# Altium footprint library ThroHoleCap.PcbLib: 81 footprints (part 5 of 6)
Each footprint in its own frame and in the unit in brackets; x right, y up, seen from the top. Pads: shape width x height; smd on the part's side, far side on the other; paste and mask are expansions set on the pad; w line width, h text height; cw(c..) or ccw(c..) is an arc to the next point about the centre after c.
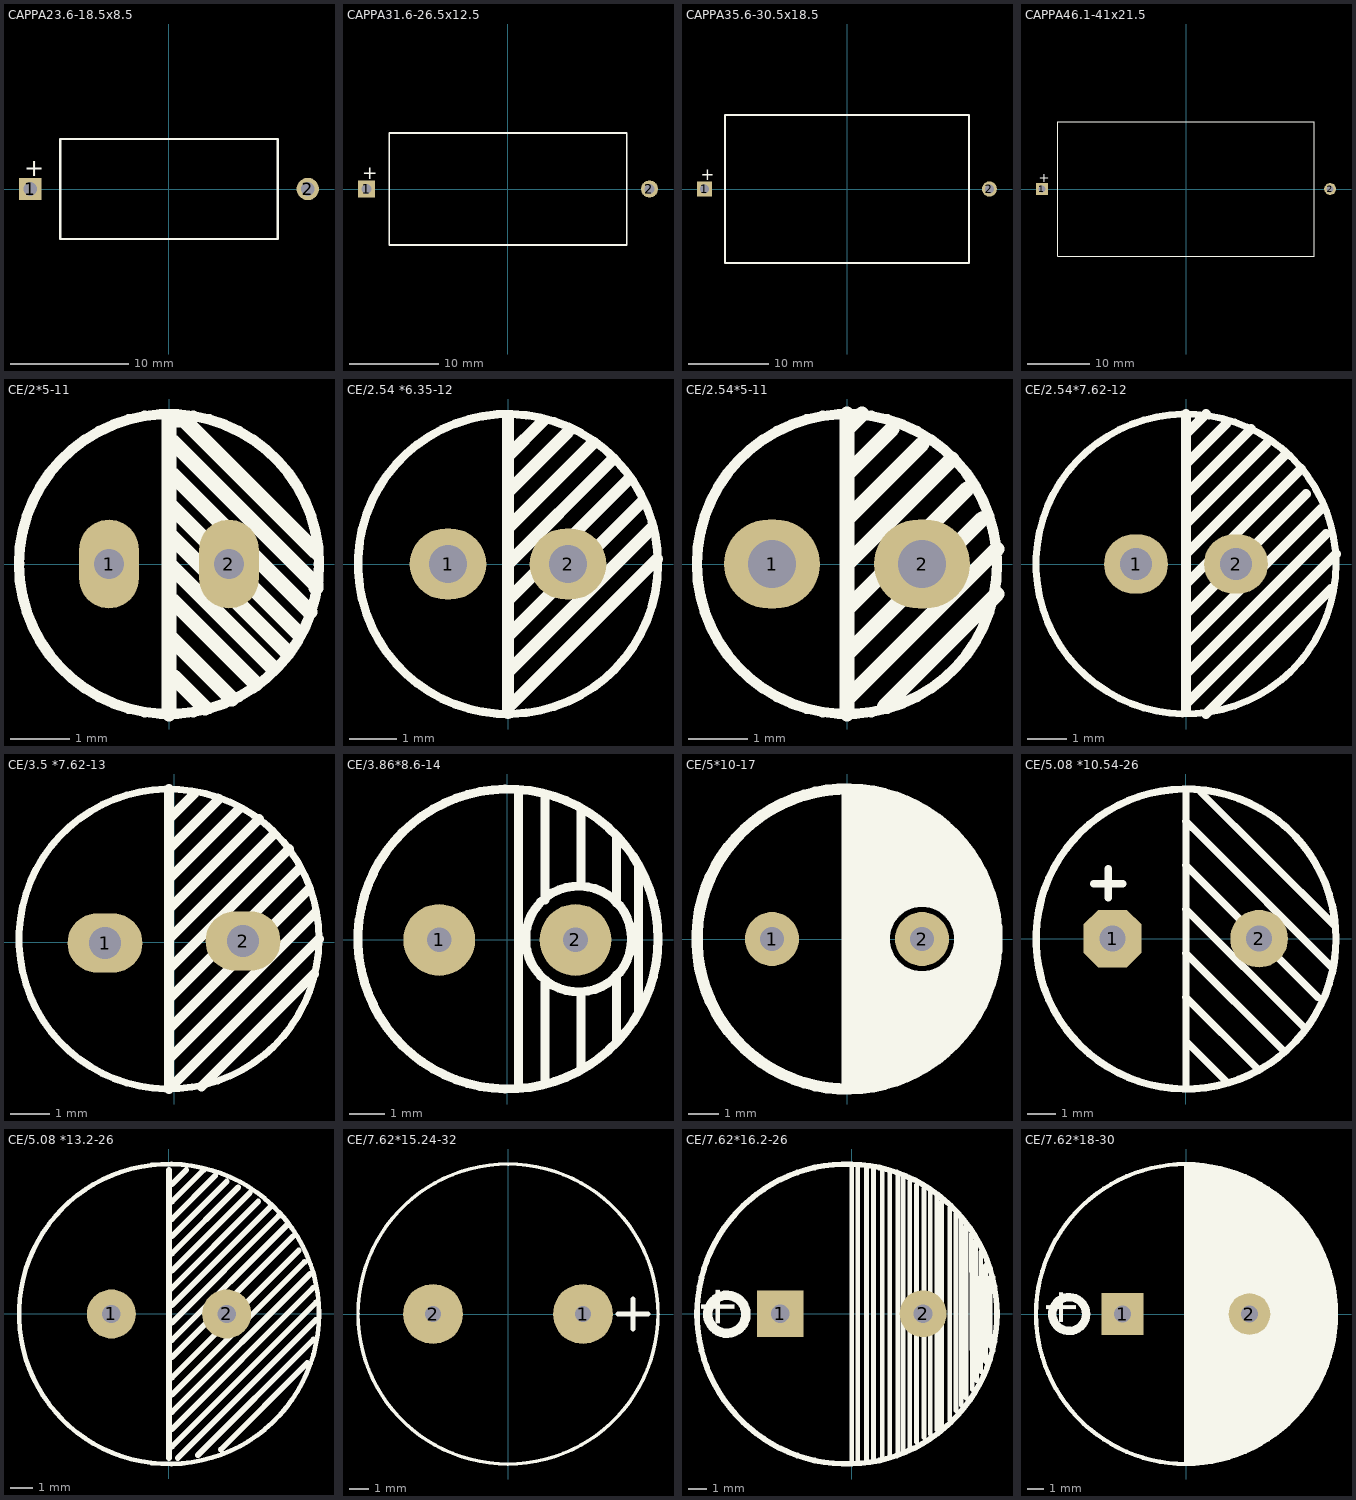
[diagram p4: the footprints below, top view; thin cyan lines are the x and y axes]

## CAPPA23.6-18.5x8.5 [mm] "Capacitor, Axial, Polarised; Body 18.5 x 8.5 mm (LxDia. max), Lead Dia. 0.8 mm (typ)"
height 5.08
pads (2):
  rect 1.9x1.9 hole 1.15: 1(-11.8,0)
  round 1.9 hole 1.15: 2(11.8,0)
Top Overlay:
  lines w0.2: -9.25,-4.25 9.25,-4.25 9.25,4.25 -9.25,4.25 -9.25,-4.25
  text "+" at -12.3,1.075 h1.5
3D body "CAPPA23.6.STEP": height 6, standoff -0.5, extent -12.049,-2.997 12.151,3.013

## CAPPA31.6-26.5x12.5 [mm] "Capacitor, Axial, Polarised; Body 26.5 x 12.5 mm (LxDia. max), Lead Dia. 0.8 mm (typ)"
height 5.08
pads (2):
  rect 1.9x1.9 hole 1.15: 1(-15.8,0)
  round 1.9 hole 1.15: 2(15.8,0)
Top Overlay:
  lines w0.2: -13.25,-6.25 -13.25,6.25 13.25,6.25 13.25,-6.25 -13.25,-6.25
  text "+" at -16.3,1.075 h1.5
3D body "CAPPA31.6.STEP": height 12, standoff -1, extent -16.122,-6.005 16.078,6.005

## CAPPA35.6-30.5x18.5 [mm] "Capacitor, Axial, Polarised; Body 30.5 x 18.5 mm (LxDia. max), Lead Dia. 0.8 mm (typ)"
height 5.08
pads (2):
  rect 1.9x1.9 hole 1.15: 1(-17.8,0)
  round 1.9 hole 1.15: 2(17.8,0)
Top Overlay:
  lines w0.2: -15.25,-9.25 15.25,-9.25 15.25,9.25 -15.25,9.25 -15.25,-9.25
  text "+" at -18.3,1.075 h1.5
3D body "CAPPA35.6.STEP": height 12, standoff -1, extent -18.091,-5.903 18.009,6.107

## CAPPA46.1-41x21.5 [mm] "Capacitor, Axial, Polarised; Body 41 x 21.5 mm (LxDia. max), Lead Dia. 0.8 mm (typ)"
height 5.08
pads (2):
  rect 1.9x1.9 hole 1.15: 1(-23.05,0)
  round 1.9 hole 1.15: 2(23.05,0)
Top Overlay:
  lines w0.2: -20.5,-10.75 -20.5,10.75 20.5,10.75 20.5,-10.75 -20.5,-10.75
  text "+" at -23.55,1.075 h1.5
3D body "CAPPA46.STEP": height 12, standoff -1, extent -23.208,-5.929 23.292,6.081

## CE/2*5-11 [mil]
pads (2):
  oval 40x59.06 hole 20: 1(-40,0) 2(40,0)
Top Overlay:
  circle w7: c0,0 r100
  lines w10: 0,-100 0,96 ; 0,0 69,-69 ; 0,20 78,-58 ; 0,40 86,-46 ; 1,-49 42,-90 ; 2,-24 58,-80 ; 2,60 94,-32 ; 2,82 98,-14 98,-16 ; 3,-75 24,-96 ; 4,96 10,96 98,8
3D body "SW3DPS-ELECTROLITIC CAPACITOR RADIAL 5X11-DEFAULT.STEP": height 433.07, standoff -98.43, extent -98,-98 98.85,98.85

## CE/2.54 *6.35-12 [mil]
pads (2):
  oval 64x59.06 hole 32: 1(-50,0) 2(50,0)
Top Overlay:
  circle w7: c0,0 r125
  lines w10: 0,-124 0,122 ; 0,-90 120,30 ; 0,-60 111,51 ; 0,-30 99,69 ; 0,0 86,86 ; 0,30 70,100 ; 0,60 50,110 ; 0,90 29,119 ; 1,-119 124,4
3D body "User Library-Cap electro 6_3x12_5x2_5mm.STEP": height 512.81, standoff -118.67, extent -124,-123.01 126.03,127.02

## CE/2.54*5-11 [mil]
pads (2):
  oval 64x59.06 hole 32: 1(-50,0) 2(50,0)
Top Overlay:
  circle w7: c0,0 r100
  lines w10: 0,-100 0,100 ; 0,-90 100,10 ; 0,-60 90,30 ; 0,-30 80,50 ; 0,0 70,70 ; 0,30 50,80 ; 0,60 30,90 ; 0,90 10,100 ; 25,-95 100,-20
3D body "SW3DPS-ELECTROLITIC CAPACITOR RADIAL 5X11-DEFAULT.STEP": height 433.07, standoff -98.43, extent -98,-98 98.85,98.85

## CE/2.54*7.62-12 [mil]
pads (2):
  oval 64x59.06 hole 32: 1(-50,0) 2(50,0)
Top Overlay:
  circle w7: c0,0 r150
  lines w10: 0,-145 0,150 ; 0,-140 140,0 150,10 ; 0,-110 140,30 ; 0,-80 130,50 135,55 ; 0,-50 120,70 ; 0,-20 110,90 115,95 ; 0,10 100,110 ; 0,40 80,120 ; 0,70 60,130 65,135 ; 0,100 40,140 ; 0,130 20,150 ; 20,-150 140,-30 145,-25
3D body "User Library-CapAluRadial_D80H115.STEP": height 137.8, standoff -492.13, extent -166.6,-169.03 168.04,165.42

## CE/3.5 *7.62-13 [mil]
pads (2):
  oval 75x59.06 hole 32: 1(-69,-1) 2(69,1)
Top Overlay:
  circle w7: c-5,3 r150
  lines w10: -5,-117 140,28 ; -5,-87 135,53 ; -5,-57 125,73 ; -5,-27 115,93 ; -5,3 100,108 ; -5,33 85,123 ; -5,63 65,133 ; -5,93 45,143 ; -5,123 20,148 ; -5,153 -5,-147 145,3 ; 27.58,-144.42 140,-32
3D body "User Library-CapAluRadial_D80H115.STEP": height 531.81, standoff -98.11, extent -165.61,-169.03 169.03,165.41

## CE/3.86*8.6-14 [mil]
pads (2):
  round 80 hole 27.56: 1(-76,0) 2(76,0)
Top Overlay:
  circle w10: c0.74,1 r167.32
  circle w10: c79.48,1 r59.05
  lines w10: 12.55,-164.35 12.55,166.35 ; 42,-160.42 42,-46.24 ; 42,44.31 42,162.42 ; 82,-144.67 82,-59 ; 82,61 82,146.67 ; 122,-113.17 122,-39 ; 122,41 122,115.17 ; 146.41,-79 146.41,81
3D body "User Library-CE_R150_D320_H570.STEP": height 566.93, standoff -114.17, extent -161.41,-160.83 161.42,162

## CE/5*10-17 [mm]
pads (2):
  round 1.8 hole 0.8: 1(-2.5,0) 2(2.5,0)
Top Overlay:
  circle w0.254: c2.5,0 r1.2
  circle w0.381: c0,0 r5
  region: 0,-5 0,0 1.3,0 1.306,-0.118 1.352,-0.348 1.442,-0.566 1.572,-0.761 1.739,-0.928 1.934,-1.058 2.152,-1.148 2.382,-1.194 2.5,-1.2 2.618,-1.194 2.848,-1.148 3.066,-1.058 3.261,-0.928 3.428,-0.761 3.558,-0.566 3.648,-0.348 3.694,-0.118 3.7,0 5,0 5,-0.328 4.914,-0.978 4.745,-1.611 4.494,-2.216 4.166,-2.784 3.767,-3.304 3.304,-3.767 2.784,-4.166 2.216,-4.494 1.611,-4.745 0.978,-4.914 0.328,-5
  region: 0,5 0,0 1.3,0 1.306,0.118 1.352,0.348 1.442,0.566 1.572,0.761 1.739,0.928 1.934,1.058 2.152,1.148 2.382,1.194 2.5,1.2 2.618,1.194 2.848,1.148 3.066,1.058 3.261,0.928 3.428,0.761 3.558,0.566 3.648,0.348 3.694,0.118 3.7,0 5,0 5,0.328 4.914,0.978 4.745,1.611 4.494,2.216 4.166,2.784 3.767,3.304 3.304,3.767 2.784,4.166 2.216,4.494 1.611,4.745 0.978,4.914 0.328,5
  lines w0.381: 0,-5 0,5
3D body "User Library-Cap electro 10x16x5_0mm.STEP": height 16.53, standoff -3.74, extent -5.051,-5 5,5.051

## CE/5.08 *10.54-26 [mm]
pads (2):
  oct 2x2 hole 0.9: 1(-2.54,0)
  round 2 hole 0.9: 2(2.54,0)
Top Overlay:
  circle w0.254: c0.006,-0.013 r5.2
  lines w0.254: -3.2,1.905 -2.184,1.905 ; -2.686,1.41 -2.686,2.426 ; -0.001,-2.027 2.539,-4.567 ; -0.001,-0.503 3.393,-3.897 ; -0.001,1.021 4.063,-3.043 ; -0.001,2.545 4.571,-2.027 ; -0.001,4.069 0.507,3.561 5.079,-1.011 ; 0.006,-5.197 0.006,5.072 ; 0.006,-5.082 0.006,-5.075 ; 0.006,-3.558 1.386,-4.938 ; 0.006,-3.05 0.006,-3.043 ; 0.507,5.085 5.131,0.482
3D body "User Library-Panasonic_EEUFK1Cxxx.STEP": height 26.86, standoff -16, extent -5.009,-5.03 5.009,4.978

## CE/5.08 *13.2-26 [mil]
pads (2):
  round 85 hole 32: 1(-100,0) 2(100,0)
Top Overlay:
  circle w8: c0,0 r260.19
  lines w10: 0,-250 0,250 ; 0,40 155,195 ; 5,-230 255,20 ; 5,-200 250,45 ; 5,-170 245,70 ; 5,-140 235,90 ; 5,-110 225,110 ; 5,-75 215,135 ; 5,-45 205,155 ; 5,-15 190,170 ; 5,15 175,185 ; 5,75 140,210 ; 5,105 120,220 ; 5,135 100,230 ; 5,165 80,240 ; 5,195 60,250 ; 5,225 30,250 ; 15,-250 254.65,-10.35 ; 50,-245 250.69,-44.31 ; 90.04,-234.96 240,-85
3D body "User Library-Capacitor, Al El, Thru Mt, 2200uF, 25V - CDE #SEK222M025ST.STEP": height 1010, standoff -1121.89, extent -255.68,-253.84 264,265.85

## CE/7.62*15.24-32 [mil]
pads (2):
  round 120 hole 32: 1(150,0) 2(-150,0)
Top Overlay:
  circle w7: c0,0 r300
  lines w10: 220,0 280,0 ; 250,-30 250,30
3D body "User Library-JAMICON_TK_D(16)F(7_5)L(31_5).STEP": height 1246.34, standoff -54.06, extent -315.55,-320 315.55,309.92

## CE/7.62*16.2-26 [mm]
pads (2):
  rect 2.5x2.5 hole 1: 1(-3.81,0)
  round 2.5 hole 1: 2(3.81,0)
Top Overlay:
  circle w0.3: c-0.248,-0.013 r8
  circle w0.508: c-6.655,-0.025 r1.016
  lines w0.254: 0,-8.001 0,7.925 ; 0.33,-7.798 0.33,7.823 ; 0.787,-7.823 0.787,7.798 ; 1.168,-7.747 1.168,7.696 ; 1.626,-7.671 1.626,7.62 ; 2.032,-7.569 2.032,7.493 ; 2.464,-7.417 2.464,7.366 ; 2.743,-7.29 2.743,7.264 ; 3.099,-7.137 3.099,7.061 ; 3.454,-6.858 3.454,6.883 ; 3.861,-6.604 3.861,6.68 ; 4.191,-6.426 4.191,6.477 ; 4.547,-6.198 4.547,6.248 ; 4.801,-6.045 4.801,5.994 ; 5.232,-5.664 5.232,5.639 ; 5.563,-5.156 5.563,5.334 ; 5.842,-4.877 5.842,5.004 ; 6.096,-4.496 6.096,4.674 ; 6.376,4.267 6.426,-4.039 ; 6.604,3.861 6.655,-3.556 ; 6.883,-3.099 6.883,3.302 ; 7.137,-2.565 7.137,2.591 ; 7.391,-1.753 7.391,1.956
  text "+" at -5.537,-0.813 h3.56
3D body "User Library-CE_R300_D650_H1000.STEP": height 25.9, standoff -3, extent -8.495,-8.251 8.005,8.249

## CE/7.62*18-30 [mm]
pads (2):
  rect 2.5x2.5 hole 1: 1(-3.81,0)
  round 2.5 hole 1: 2(3.81,0)
Top Overlay:
  circle w0.254: c0,0 r9
  circle w0.508: c-7.01,0 r1.016
  region: 0,-8.995 0.442,-8.995 1.322,-8.908 2.189,-8.735 3.036,-8.479 3.853,-8.14 4.633,-7.723 5.368,-7.232 6.051,-6.671 6.677,-6.046 7.238,-5.362 7.729,-4.627 8.146,-3.847 8.484,-3.03 8.741,-2.184 8.913,-1.317 9,-0.437 9,0.448 8.913,1.328 8.741,2.195 8.484,3.041 8.146,3.858 7.729,4.638 7.238,5.373 6.677,6.057 6.051,6.682 5.368,7.243 4.633,7.734 3.853,8.151 3.036,8.49 2.189,8.746 1.322,8.919 0.442,9.005 0,9.005
  lines w0.254: 0,-9 0,9
  text "+" at -5.893,-0.787 h3.56
3D body "User Library-Capacitor Radial Electrolitic.STEP": height 40.01, standoff -2.7, extent -9,-9 9.01,9